# Altium footprint library con-samtec.PCBLIB: 805 footprints (part 37 of 55)
Each footprint in its own frame and in the unit in brackets; x right, y up, seen from the top. Pads: shape width x height; smd on the part's side, far side on the other; paste and mask are expansions set on the pad; w line width, h text height; cw(c..) or ccw(c..) is an arc to the next point about the centre after c.
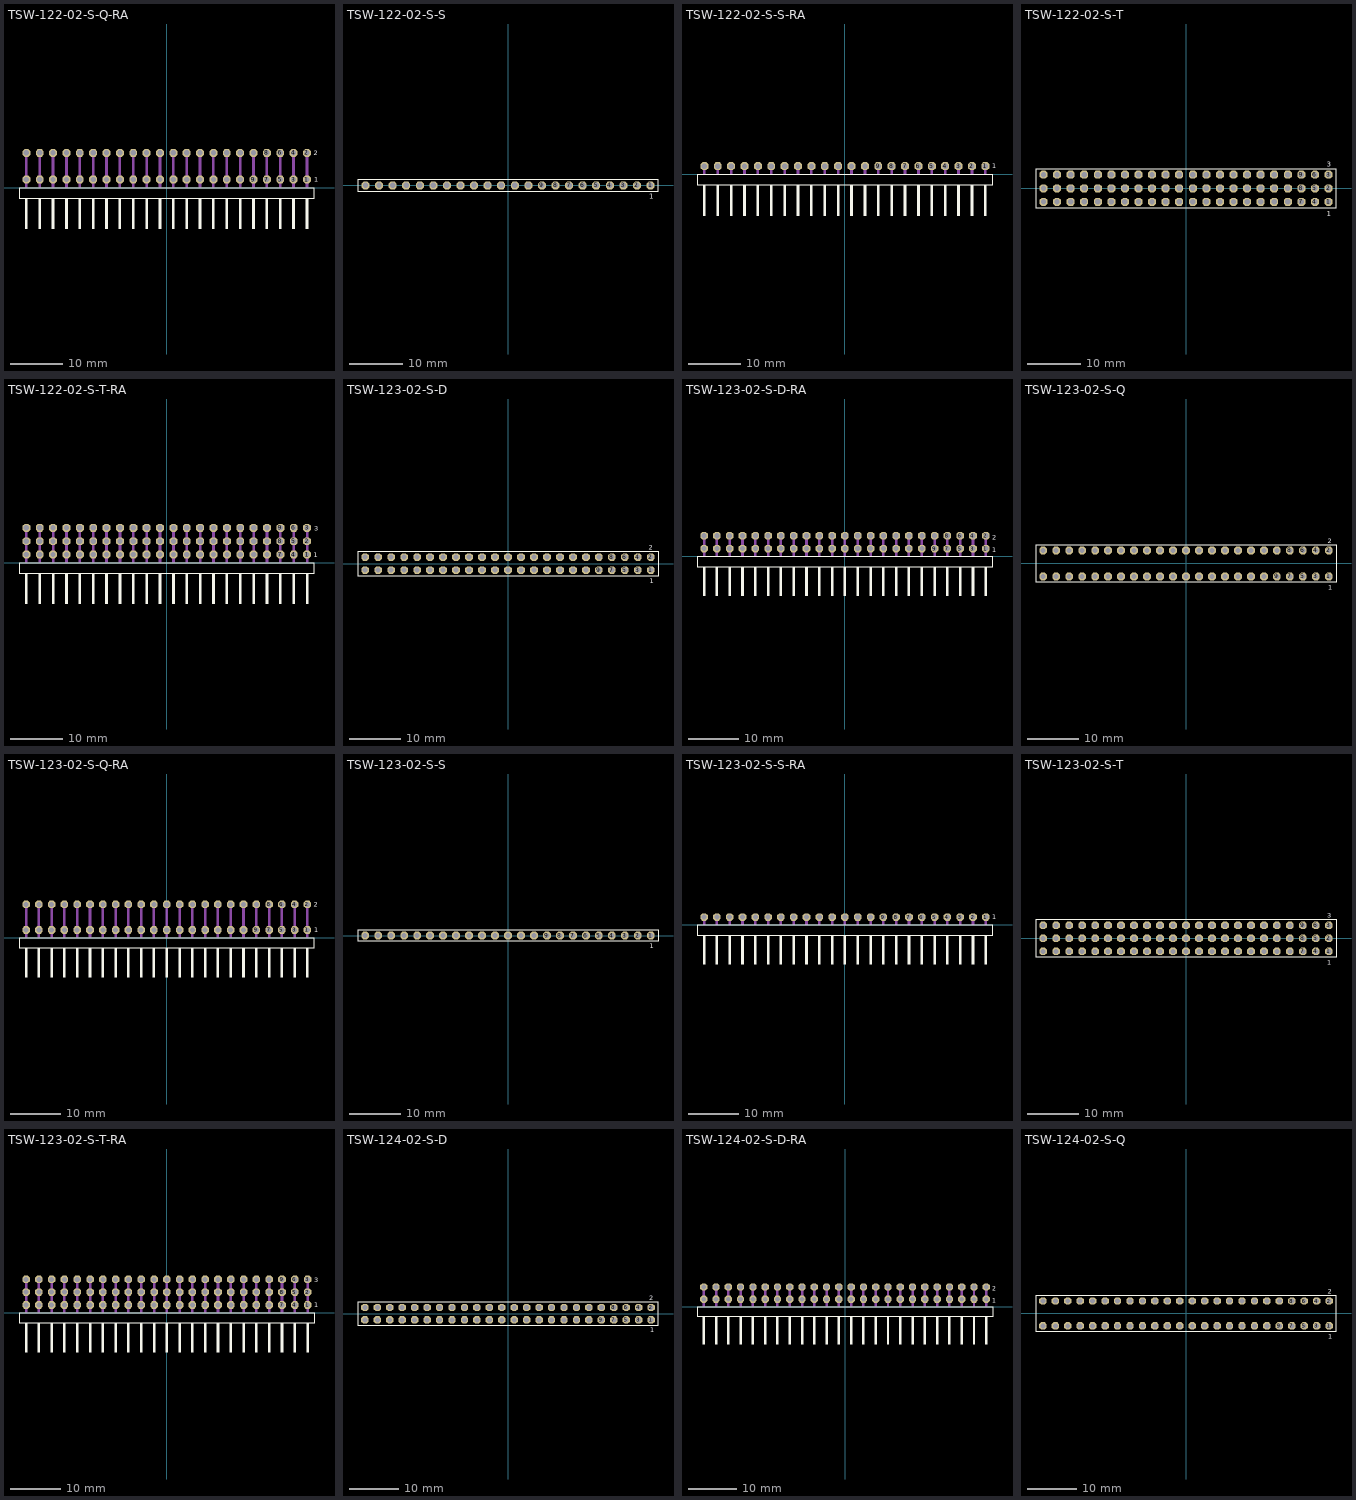
[diagram p36: the footprints below, top view; thin cyan lines are the x and y axes]

## TSW-122-02-S-Q-RA [mil]
pads (44):
  oct 59.06x59.06 hole 39.37: 1(1050,60) 2(1050,260) 3(950,60) 4(950,260) 5(850,60) 6(850,260) 7(750,60) 8(750,260) 9(650,60) 10(650,260) 11(550,60) 12(550,260) 13(450,60) 14(450,260) 15(350,60) 16(350,260) 17(250,60) 18(250,260) 19(150,60) 20(150,260) 21(50,60) 22(50,260) 23(-50,60) 24(-50,260) 25(-150,60) 26(-150,260) 27(-250,60) 28(-250,260) 29(-350,60) 30(-350,260) 31(-450,60) 32(-450,260) 33(-550,60) 34(-550,260) 35(-650,60) 36(-650,260) 37(-750,60) 38(-750,260) 39(-850,60) 40(-850,260) 41(-950,60) 42(-950,260) 43(-1050,60) 44(-1050,260)
Top Overlay:
  rectangle: -1060,-310.63 -1040,-80.32
  rectangle: -960,-310.63 -940,-80.32
  rectangle: -860,-310.63 -840,-80.32
  rectangle: -760,-310.63 -740,-80.32
  rectangle: -660,-310.63 -640,-80.32
  rectangle: -560,-310.63 -540,-80.32
  rectangle: -460,-310.63 -440,-80.32
  rectangle: -360,-310.63 -340,-80.32
  rectangle: -260,-310.63 -240,-80.32
  rectangle: -160,-310.63 -140,-80.32
  rectangle: -60,-310.63 -40,-80.32
  rectangle: 40,-310.63 60,-80.32
  rectangle: 140,-310.63 160,-80.32
  rectangle: 240,-310.63 260,-80.32
  rectangle: 340,-310.63 360,-80.32
  rectangle: 440,-310.63 460,-80.32
  rectangle: 540,-310.63 560,-80.32
  rectangle: 640,-310.63 660,-80.32
  rectangle: 740,-310.63 760,-80.32
  rectangle: 840,-310.63 860,-80.32
  rectangle: 940,-310.63 960,-80.32
  rectangle: 1040,-310.63 1060,-80.32
  lines w8: -1105.08,-80.55 1105.08,-80.55 1105.08,-4.17 -1105.08,-4.17 -1105.08,-80.55
  text "1" at 1103.54,43.31 h36.81
  text "2" at 1101.18,242.72 h36.81
Mechanical 16:
  rectangle: -1060,0 -1040,270
  rectangle: -960,0 -940,270
  rectangle: -860,0 -840,270
  rectangle: -760,0 -740,270
  rectangle: -660,0 -640,270
  rectangle: -560,0 -540,270
  rectangle: -460,0 -440,270
  rectangle: -360,0 -340,270
  rectangle: -260,0 -240,270
  rectangle: -160,0 -140,270
  rectangle: -60,0 -40,270
  rectangle: 40,0 60,270
  rectangle: 140,0 160,270
  rectangle: 240,0 260,270
  rectangle: 340,0 360,270
  rectangle: 440,0 460,270
  rectangle: 540,0 560,270
  rectangle: 640,0 660,270
  rectangle: 740,0 760,270
  rectangle: 840,0 860,270
  rectangle: 940,0 960,270
  rectangle: 1040,0 1060,270

## TSW-122-02-S-S [mm]
pads (22):
  oct 1.5x1.5 hole 1: 1(26.67,0) 2(24.13,0) 3(21.59,0) 4(19.05,0) 5(16.51,0) 6(13.97,0) 7(11.43,0) 8(8.89,0) 9(6.35,0) 10(3.81,0) 11(1.27,0) 12(-1.27,0) 13(-3.81,0) 14(-6.35,0) 15(-8.89,0) 16(-11.43,0) 17(-13.97,0) 18(-16.51,0) 19(-19.05,0) 20(-21.59,0) 21(-24.13,0) 22(-26.67,0)
Top Overlay:
  lines w0.203: -28.069,-1.155 28.069,-1.155 28.069,1.155 -28.069,1.155 -28.069,-1.155
  text "1" at 26.412,-2.498 h0.94
Mechanical 16:
  rectangle: -27.02,-0.35 -26.32,0.35
  rectangle: -24.48,-0.35 -23.78,0.35
  rectangle: -21.94,-0.35 -21.24,0.35
  rectangle: -19.4,-0.35 -18.7,0.35
  rectangle: -16.86,-0.35 -16.16,0.35
  rectangle: -14.32,-0.35 -13.62,0.35
  rectangle: -11.78,-0.35 -11.08,0.35
  rectangle: -9.24,-0.35 -8.54,0.35
  rectangle: -6.7,-0.35 -6,0.35
  rectangle: -4.16,-0.35 -3.46,0.35
  rectangle: -1.62,-0.35 -0.92,0.35
  rectangle: 0.92,-0.35 1.62,0.35
  rectangle: 3.46,-0.35 4.16,0.35
  rectangle: 6,-0.35 6.7,0.35
  rectangle: 8.54,-0.35 9.24,0.35
  rectangle: 11.08,-0.35 11.78,0.35
  rectangle: 13.62,-0.35 14.32,0.35
  rectangle: 16.16,-0.35 16.86,0.35
  rectangle: 18.7,-0.35 19.4,0.35
  rectangle: 21.24,-0.35 21.94,0.35
  rectangle: 23.78,-0.35 24.48,0.35
  rectangle: 26.32,-0.35 27.02,0.35

## TSW-122-02-S-S-RA [mil]
pads (22):
  oct 59.06x59.06 hole 39.37: 1(1050,60) 2(950,60) 3(850,60) 4(750,60) 5(650,60) 6(550,60) 7(450,60) 8(350,60) 9(250,60) 10(150,60) 11(50,60) 12(-50,60) 13(-150,60) 14(-250,60) 15(-350,60) 16(-450,60) 17(-550,60) 18(-650,60) 19(-750,60) 20(-850,60) 21(-950,60) 22(-1050,60)
Top Overlay:
  rectangle: -1060,-310.63 -1040,-80.32
  rectangle: -960,-310.63 -940,-80.32
  rectangle: -860,-310.63 -840,-80.32
  rectangle: -760,-310.63 -740,-80.32
  rectangle: -660,-310.63 -640,-80.32
  rectangle: -560,-310.63 -540,-80.32
  rectangle: -460,-310.63 -440,-80.32
  rectangle: -360,-310.63 -340,-80.32
  rectangle: -260,-310.63 -240,-80.32
  rectangle: -160,-310.63 -140,-80.32
  rectangle: -60,-310.63 -40,-80.32
  rectangle: 40,-310.63 60,-80.32
  rectangle: 140,-310.63 160,-80.32
  rectangle: 240,-310.63 260,-80.32
  rectangle: 340,-310.63 360,-80.32
  rectangle: 440,-310.63 460,-80.32
  rectangle: 540,-310.63 560,-80.32
  rectangle: 640,-310.63 660,-80.32
  rectangle: 740,-310.63 760,-80.32
  rectangle: 840,-310.63 860,-80.32
  rectangle: 940,-310.63 960,-80.32
  rectangle: 1040,-310.63 1060,-80.32
  lines w8: -1105.08,-80.55 1105.08,-80.55 1105.08,-4.17 -1105.08,-4.17 -1105.08,-80.55
  text "1" at 1100.47,45.35 h36.81
Mechanical 16:
  rectangle: -1060,0 -1040,70
  rectangle: -960,0 -940,70
  rectangle: -860,0 -840,70
  rectangle: -760,0 -740,70
  rectangle: -660,0 -640,70
  rectangle: -560,0 -540,70
  rectangle: -460,0 -440,70
  rectangle: -360,0 -340,70
  rectangle: -260,0 -240,70
  rectangle: -160,0 -140,70
  rectangle: -60,0 -40,70
  rectangle: 40,0 60,70
  rectangle: 140,0 160,70
  rectangle: 240,0 260,70
  rectangle: 340,0 360,70
  rectangle: 440,0 460,70
  rectangle: 540,0 560,70
  rectangle: 640,0 660,70
  rectangle: 740,0 760,70
  rectangle: 840,0 860,70
  rectangle: 940,0 960,70
  rectangle: 1040,0 1060,70

## TSW-122-02-S-T [mm]
pads (66):
  oct 1.5x1.5 hole 1: 1(26.67,-2.54) 2(26.67,0) 3(26.67,2.54) 4(24.13,-2.54) 5(24.13,0) 6(24.13,2.54) 7(21.59,-2.54) 8(21.59,0) 9(21.59,2.54) 10(19.05,-2.54) 11(19.05,0) 12(19.05,2.54) 13(16.51,-2.54) 14(16.51,0) 15(16.51,2.54) 16(13.97,-2.54) 17(13.97,0) 18(13.97,2.54) 19(11.43,-2.54) 20(11.43,0) 21(11.43,2.54) 22(8.89,-2.54) 23(8.89,0) 24(8.89,2.54) 25(6.35,-2.54) 26(6.35,0) 27(6.35,2.54) 28(3.81,-2.54) 29(3.81,0) 30(3.81,2.54) 31(1.27,-2.54) 32(1.27,0) 33(1.27,2.54) 34(-1.27,-2.54) 35(-1.27,0) 36(-1.27,2.54) 37(-3.81,-2.54) 38(-3.81,0) 39(-3.81,2.54) 40(-6.35,-2.54) 41(-6.35,0) 42(-6.35,2.54) 43(-8.89,-2.54) 44(-8.89,0) 45(-8.89,2.54) 46(-11.43,-2.54) 47(-11.43,0) 48(-11.43,2.54) 49(-13.97,-2.54) 50(-13.97,0) 51(-13.97,2.54) 52(-16.51,-2.54) 53(-16.51,0) 54(-16.51,2.54) 55(-19.05,-2.54) 56(-19.05,0) 57(-19.05,2.54) 58(-21.59,-2.54) 59(-21.59,0) 60(-21.59,2.54) 61(-24.13,-2.54) 62(-24.13,0) 63(-24.13,2.54) 64(-26.67,-2.54) 65(-26.67,0) 66(-26.67,2.54)
Top Overlay:
  lines w0.203: -28.069,-3.695 28.069,-3.695 28.069,3.695 -28.069,3.695 -28.069,-3.695
  text "1" at 26.362,-5.188 h0.94
  text "3" at 26.358,3.989 h0.94
Mechanical 16:
  rectangle: -27.02,-2.89 -26.32,-2.19
  rectangle: -27.02,-0.35 -26.32,0.35
  rectangle: -27.02,2.19 -26.32,2.89
  rectangle: -24.48,-2.89 -23.78,-2.19
  rectangle: -24.48,-0.35 -23.78,0.35
  rectangle: -24.48,2.19 -23.78,2.89
  rectangle: -21.94,-2.89 -21.24,-2.19
  rectangle: -21.94,-0.35 -21.24,0.35
  rectangle: -21.94,2.19 -21.24,2.89
  rectangle: -19.4,-2.89 -18.7,-2.19
  rectangle: -19.4,-0.35 -18.7,0.35
  rectangle: -19.4,2.19 -18.7,2.89
  rectangle: -16.86,-2.89 -16.16,-2.19
  rectangle: -16.86,-0.35 -16.16,0.35
  rectangle: -16.86,2.19 -16.16,2.89
  rectangle: -14.32,-2.89 -13.62,-2.19
  rectangle: -14.32,-0.35 -13.62,0.35
  rectangle: -14.32,2.19 -13.62,2.89
  rectangle: -11.78,-2.89 -11.08,-2.19
  rectangle: -11.78,-0.35 -11.08,0.35
  rectangle: -11.78,2.19 -11.08,2.89
  rectangle: -9.24,-2.89 -8.54,-2.19
  rectangle: -9.24,-0.35 -8.54,0.35
  rectangle: -9.24,2.19 -8.54,2.89
  rectangle: -6.7,-2.89 -6,-2.19
  rectangle: -6.7,-0.35 -6,0.35
  rectangle: -6.7,2.19 -6,2.89
  rectangle: -4.16,-2.89 -3.46,-2.19
  rectangle: -4.16,-0.35 -3.46,0.35
  rectangle: -4.16,2.19 -3.46,2.89
  rectangle: -1.62,-2.89 -0.92,-2.19
  rectangle: -1.62,-0.35 -0.92,0.35
  rectangle: -1.62,2.19 -0.92,2.89
  rectangle: 0.92,-2.89 1.62,-2.19
  rectangle: 0.92,-0.35 1.62,0.35
  rectangle: 0.92,2.19 1.62,2.89
  rectangle: 3.46,-2.89 4.16,-2.19
  rectangle: 3.46,-0.35 4.16,0.35
  rectangle: 3.46,2.19 4.16,2.89
  rectangle: 6,-2.89 6.7,-2.19
  rectangle: 6,-0.35 6.7,0.35
  rectangle: 6,2.19 6.7,2.89
  rectangle: 8.54,-2.89 9.24,-2.19
  rectangle: 8.54,-0.35 9.24,0.35
  rectangle: 8.54,2.19 9.24,2.89
  rectangle: 11.08,-2.89 11.78,-2.19
  rectangle: 11.08,-0.35 11.78,0.35
  rectangle: 11.08,2.19 11.78,2.89
  rectangle: 13.62,-2.89 14.32,-2.19
  rectangle: 13.62,-0.35 14.32,0.35
  rectangle: 13.62,2.19 14.32,2.89
  rectangle: 16.16,-2.89 16.86,-2.19
  rectangle: 16.16,-0.35 16.86,0.35
  rectangle: 16.16,2.19 16.86,2.89
  rectangle: 18.7,-2.89 19.4,-2.19
  rectangle: 18.7,-0.35 19.4,0.35
  rectangle: 18.7,2.19 19.4,2.89
  rectangle: 21.24,-2.89 21.94,-2.19
  rectangle: 21.24,-0.35 21.94,0.35
  rectangle: 21.24,2.19 21.94,2.89
  rectangle: 23.78,-2.89 24.48,-2.19
  rectangle: 23.78,-0.35 24.48,0.35
  rectangle: 23.78,2.19 24.48,2.89
  rectangle: 26.32,-2.89 27.02,-2.19
  rectangle: 26.32,-0.35 27.02,0.35
  rectangle: 26.32,2.19 27.02,2.89

## TSW-122-02-S-T-RA [mil]
pads (66):
  oct 59.06x59.06 hole 39.37: 1(1050,60) 2(1050,160) 3(1050,260) 4(950,60) 5(950,160) 6(950,260) 7(850,60) 8(850,160) 9(850,260) 10(750,60) 11(750,160) 12(750,260) 13(650,60) 14(650,160) 15(650,260) 16(550,60) 17(550,160) 18(550,260) 19(450,60) 20(450,160) 21(450,260) 22(350,60) 23(350,160) 24(350,260) 25(250,60) 26(250,160) 27(250,260) 28(150,60) 29(150,160) 30(150,260) 31(50,60) 32(50,160) 33(50,260) 34(-50,60) 35(-50,160) 36(-50,260) 37(-150,60) 38(-150,160) 39(-150,260) 40(-250,60) 41(-250,160) 42(-250,260) 43(-350,60) 44(-350,160) 45(-350,260) 46(-450,60) 47(-450,160) 48(-450,260) 49(-550,60) 50(-550,160) 51(-550,260) 52(-650,60) 53(-650,160) 54(-650,260) 55(-750,60) 56(-750,160) 57(-750,260) 58(-850,60) 59(-850,160) 60(-850,260) 61(-950,60) 62(-950,160) 63(-950,260) 64(-1050,60) 65(-1050,160) 66(-1050,260)
Top Overlay:
  rectangle: -1060,-310.63 -1040,-80.32
  rectangle: -960,-310.63 -940,-80.32
  rectangle: -860,-310.63 -840,-80.32
  rectangle: -760,-310.63 -740,-80.32
  rectangle: -660,-310.63 -640,-80.32
  rectangle: -560,-310.63 -540,-80.32
  rectangle: -460,-310.63 -440,-80.32
  rectangle: -360,-310.63 -340,-80.32
  rectangle: -260,-310.63 -240,-80.32
  rectangle: -160,-310.63 -140,-80.32
  rectangle: -60,-310.63 -40,-80.32
  rectangle: 40,-310.63 60,-80.32
  rectangle: 140,-310.63 160,-80.32
  rectangle: 240,-310.63 260,-80.32
  rectangle: 340,-310.63 360,-80.32
  rectangle: 440,-310.63 460,-80.32
  rectangle: 540,-310.63 560,-80.32
  rectangle: 640,-310.63 660,-80.32
  rectangle: 740,-310.63 760,-80.32
  rectangle: 840,-310.63 860,-80.32
  rectangle: 940,-310.63 960,-80.32
  rectangle: 1040,-310.63 1060,-80.32
  lines w8: -1105.08,-80.55 1105.08,-80.55 1105.08,-4.17 -1105.08,-4.17 -1105.08,-80.55
  text "1" at 1101.57,41.34 h36.81
  text "3" at 1102.17,236.81 h36.81
Mechanical 16:
  rectangle: -1060,0 -1040,270
  rectangle: -960,0 -940,270
  rectangle: -860,0 -840,270
  rectangle: -760,0 -740,270
  rectangle: -660,0 -640,270
  rectangle: -560,0 -540,270
  rectangle: -460,0 -440,270
  rectangle: -360,0 -340,270
  rectangle: -260,0 -240,270
  rectangle: -160,0 -140,270
  rectangle: -60,0 -40,270
  rectangle: 40,0 60,270
  rectangle: 140,0 160,270
  rectangle: 240,0 260,270
  rectangle: 340,0 360,270
  rectangle: 440,0 460,270
  rectangle: 540,0 560,270
  rectangle: 640,0 660,270
  rectangle: 740,0 760,270
  rectangle: 840,0 860,270
  rectangle: 940,0 960,270
  rectangle: 1040,0 1060,270

## TSW-123-02-S-D [mm]
pads (46):
  oct 1.5x1.5 hole 1: 1(27.94,-1.27) 2(27.94,1.27) 3(25.4,-1.27) 4(25.4,1.27) 5(22.86,-1.27) 6(22.86,1.27) 7(20.32,-1.27) 8(20.32,1.27) 9(17.78,-1.27) 10(17.78,1.27) 11(15.24,-1.27) 12(15.24,1.27) 13(12.7,-1.27) 14(12.7,1.27) 15(10.16,-1.27) 16(10.16,1.27) 17(7.62,-1.27) 18(7.62,1.27) 19(5.08,-1.27) 20(5.08,1.27) 21(2.54,-1.27) 22(2.54,1.27) 23(0,-1.27) 24(0,1.27) 25(-2.54,-1.27) 26(-2.54,1.27) 27(-5.08,-1.27) 28(-5.08,1.27) 29(-7.62,-1.27) 30(-7.62,1.27) 31(-10.16,-1.27) 32(-10.16,1.27) 33(-12.7,-1.27) 34(-12.7,1.27) 35(-15.24,-1.27) 36(-15.24,1.27) 37(-17.78,-1.27) 38(-17.78,1.27) 39(-20.32,-1.27) 40(-20.32,1.27) 41(-22.86,-1.27) 42(-22.86,1.27) 43(-25.4,-1.27) 44(-25.4,1.27) 45(-27.94,-1.27) 46(-27.94,1.27)
Top Overlay:
  lines w0.203: -29.339,-2.425 29.339,-2.425 29.339,2.425 -29.339,2.425 -29.339,-2.425
  text "1" at 27.732,-3.818 h0.94
  text "2" at 27.557,2.744 h0.94
Mechanical 16:
  rectangle: -28.29,-1.62 -27.59,-0.92
  rectangle: -28.29,0.92 -27.59,1.62
  rectangle: -25.75,-1.62 -25.05,-0.92
  rectangle: -25.75,0.92 -25.05,1.62
  rectangle: -23.21,-1.62 -22.51,-0.92
  rectangle: -23.21,0.92 -22.51,1.62
  rectangle: -20.67,-1.62 -19.97,-0.92
  rectangle: -20.67,0.92 -19.97,1.62
  rectangle: -18.13,-1.62 -17.43,-0.92
  rectangle: -18.13,0.92 -17.43,1.62
  rectangle: -15.59,-1.62 -14.89,-0.92
  rectangle: -15.59,0.92 -14.89,1.62
  rectangle: -13.05,-1.62 -12.35,-0.92
  rectangle: -13.05,0.92 -12.35,1.62
  rectangle: -10.51,-1.62 -9.81,-0.92
  rectangle: -10.51,0.92 -9.81,1.62
  rectangle: -7.97,-1.62 -7.27,-0.92
  rectangle: -7.97,0.92 -7.27,1.62
  rectangle: -5.43,-1.62 -4.73,-0.92
  rectangle: -5.43,0.92 -4.73,1.62
  rectangle: -2.89,-1.62 -2.19,-0.92
  rectangle: -2.89,0.92 -2.19,1.62
  rectangle: -0.35,-1.62 0.35,-0.92
  rectangle: -0.35,0.92 0.35,1.62
  rectangle: 2.19,-1.62 2.89,-0.92
  rectangle: 2.19,0.92 2.89,1.62
  rectangle: 4.73,-1.62 5.43,-0.92
  rectangle: 4.73,0.92 5.43,1.62
  rectangle: 7.27,-1.62 7.97,-0.92
  rectangle: 7.27,0.92 7.97,1.62
  rectangle: 9.81,-1.62 10.51,-0.92
  rectangle: 9.81,0.92 10.51,1.62
  rectangle: 12.35,-1.62 13.05,-0.92
  rectangle: 12.35,0.92 13.05,1.62
  rectangle: 14.89,-1.62 15.59,-0.92
  rectangle: 14.89,0.92 15.59,1.62
  rectangle: 17.43,-1.62 18.13,-0.92
  rectangle: 17.43,0.92 18.13,1.62
  rectangle: 19.97,-1.62 20.67,-0.92
  rectangle: 19.97,0.92 20.67,1.62
  rectangle: 22.51,-1.62 23.21,-0.92
  rectangle: 22.51,0.92 23.21,1.62
  rectangle: 25.05,-1.62 25.75,-0.92
  rectangle: 25.05,0.92 25.75,1.62
  rectangle: 27.59,-1.62 28.29,-0.92
  rectangle: 27.59,0.92 28.29,1.62

## TSW-123-02-S-D-RA [mil]
pads (46):
  oct 59.06x59.06 hole 39.37: 1(1100,60) 2(1100,160) 3(1000,60) 4(1000,160) 5(900,60) 6(900,160) 7(800,60) 8(800,160) 9(700,60) 10(700,160) 11(600,60) 12(600,160) 13(500,60) 14(500,160) 15(400,60) 16(400,160) 17(300,60) 18(300,160) 19(200,60) 20(200,160) 21(100,60) 22(100,160) 23(0,60) 24(0,160) 25(-100,60) 26(-100,160) 27(-200,60) 28(-200,160) 29(-300,60) 30(-300,160) 31(-400,60) 32(-400,160) 33(-500,60) 34(-500,160) 35(-600,60) 36(-600,160) 37(-700,60) 38(-700,160) 39(-800,60) 40(-800,160) 41(-900,60) 42(-900,160) 43(-1000,60) 44(-1000,160) 45(-1100,60) 46(-1100,160)
Top Overlay:
  rectangle: -1110,-310.63 -1090,-80.32
  rectangle: -1010,-310.63 -990,-80.32
  rectangle: -910,-310.63 -890,-80.32
  rectangle: -810,-310.63 -790,-80.32
  rectangle: -710,-310.63 -690,-80.32
  rectangle: -610,-310.63 -590,-80.32
  rectangle: -510,-310.63 -490,-80.32
  rectangle: -410,-310.63 -390,-80.32
  rectangle: -310,-310.63 -290,-80.32
  rectangle: -210,-310.63 -190,-80.32
  rectangle: -110,-310.63 -90,-80.32
  rectangle: -10,-310.63 10,-80.32
  rectangle: 90,-310.63 110,-80.32
  rectangle: 190,-310.63 210,-80.32
  rectangle: 290,-310.63 310,-80.32
  rectangle: 390,-310.63 410,-80.32
  rectangle: 490,-310.63 510,-80.32
  rectangle: 590,-310.63 610,-80.32
  rectangle: 690,-310.63 710,-80.32
  rectangle: 790,-310.63 810,-80.32
  rectangle: 890,-310.63 910,-80.32
  rectangle: 990,-310.63 1010,-80.32
  rectangle: 1090,-310.63 1110,-80.32
  lines w8: -1155.08,-80.55 1155.08,-80.55 1155.08,-4.17 -1155.08,-4.17 -1155.08,-80.55
  text "1" at 1150.59,30.51 h36.81
  text "2" at 1149.21,129.53 h36.81
Mechanical 16:
  rectangle: -1110,0 -1090,170
  rectangle: -1010,0 -990,170
  rectangle: -910,0 -890,170
  rectangle: -810,0 -790,170
  rectangle: -710,0 -690,170
  rectangle: -610,0 -590,170
  rectangle: -510,0 -490,170
  rectangle: -410,0 -390,170
  rectangle: -310,0 -290,170
  rectangle: -210,0 -190,170
  rectangle: -110,0 -90,170
  rectangle: -10,0 10,170
  rectangle: 90,0 110,170
  rectangle: 190,0 210,170
  rectangle: 290,0 310,170
  rectangle: 390,0 410,170
  rectangle: 490,0 510,170
  rectangle: 590,0 610,170
  rectangle: 690,0 710,170
  rectangle: 790,0 810,170
  rectangle: 890,0 910,170
  rectangle: 990,0 1010,170
  rectangle: 1090,0 1110,170

## TSW-123-02-S-Q [mm]
pads (46):
  oct 1.5x1.5 hole 1: 1(27.94,-2.54) 2(27.94,2.54) 3(25.4,-2.54) 4(25.4,2.54) 5(22.86,-2.54) 6(22.86,2.54) 7(20.32,-2.54) 8(20.32,2.54) 9(17.78,-2.54) 10(17.78,2.54) 11(15.24,-2.54) 12(15.24,2.54) 13(12.7,-2.54) 14(12.7,2.54) 15(10.16,-2.54) 16(10.16,2.54) 17(7.62,-2.54) 18(7.62,2.54) 19(5.08,-2.54) 20(5.08,2.54) 21(2.54,-2.54) 22(2.54,2.54) 23(0,-2.54) 24(0,2.54) 25(-2.54,-2.54) 26(-2.54,2.54) 27(-5.08,-2.54) 28(-5.08,2.54) 29(-7.62,-2.54) 30(-7.62,2.54) 31(-10.16,-2.54) 32(-10.16,2.54) 33(-12.7,-2.54) 34(-12.7,2.54) 35(-15.24,-2.54) 36(-15.24,2.54) 37(-17.78,-2.54) 38(-17.78,2.54) 39(-20.32,-2.54) 40(-20.32,2.54) 41(-22.86,-2.54) 42(-22.86,2.54) 43(-25.4,-2.54) 44(-25.4,2.54) 45(-27.94,-2.54) 46(-27.94,2.54)
Top Overlay:
  lines w0.203: -29.339,-3.695 29.339,-3.695 29.339,3.695 -29.339,3.695 -29.339,-3.695
  text "1" at 27.782,-5.138 h0.94
  text "2" at 27.682,3.989 h0.94
Mechanical 16:
  rectangle: -28.29,-2.89 -27.59,-2.19
  rectangle: -28.29,2.19 -27.59,2.89
  rectangle: -25.75,-2.89 -25.05,-2.19
  rectangle: -25.75,2.19 -25.05,2.89
  rectangle: -23.21,-2.89 -22.51,-2.19
  rectangle: -23.21,2.19 -22.51,2.89
  rectangle: -20.67,-2.89 -19.97,-2.19
  rectangle: -20.67,2.19 -19.97,2.89
  rectangle: -18.13,-2.89 -17.43,-2.19
  rectangle: -18.13,2.19 -17.43,2.89
  rectangle: -15.59,-2.89 -14.89,-2.19
  rectangle: -15.59,2.19 -14.89,2.89
  rectangle: -13.05,-2.89 -12.35,-2.19
  rectangle: -13.05,2.19 -12.35,2.89
  rectangle: -10.51,-2.89 -9.81,-2.19
  rectangle: -10.51,2.19 -9.81,2.89
  rectangle: -7.97,-2.89 -7.27,-2.19
  rectangle: -7.97,2.19 -7.27,2.89
  rectangle: -5.43,-2.89 -4.73,-2.19
  rectangle: -5.43,2.19 -4.73,2.89
  rectangle: -2.89,-2.89 -2.19,-2.19
  rectangle: -2.89,2.19 -2.19,2.89
  rectangle: -0.35,-2.89 0.35,-2.19
  rectangle: -0.35,2.19 0.35,2.89
  rectangle: 2.19,-2.89 2.89,-2.19
  rectangle: 2.19,2.19 2.89,2.89
  rectangle: 4.73,-2.89 5.43,-2.19
  rectangle: 4.73,2.19 5.43,2.89
  rectangle: 7.27,-2.89 7.97,-2.19
  rectangle: 7.27,2.19 7.97,2.89
  rectangle: 9.81,-2.89 10.51,-2.19
  rectangle: 9.81,2.19 10.51,2.89
  rectangle: 12.35,-2.89 13.05,-2.19
  rectangle: 12.35,2.19 13.05,2.89
  rectangle: 14.89,-2.89 15.59,-2.19
  rectangle: 14.89,2.19 15.59,2.89
  rectangle: 17.43,-2.89 18.13,-2.19
  rectangle: 17.43,2.19 18.13,2.89
  rectangle: 19.97,-2.89 20.67,-2.19
  rectangle: 19.97,2.19 20.67,2.89
  rectangle: 22.51,-2.89 23.21,-2.19
  rectangle: 22.51,2.19 23.21,2.89
  rectangle: 25.05,-2.89 25.75,-2.19
  rectangle: 25.05,2.19 25.75,2.89
  rectangle: 27.59,-2.89 28.29,-2.19
  rectangle: 27.59,2.19 28.29,2.89

## TSW-123-02-S-Q-RA [mil]
pads (46):
  oct 59.06x59.06 hole 39.37: 1(1100,60) 2(1100,260) 3(1000,60) 4(1000,260) 5(900,60) 6(900,260) 7(800,60) 8(800,260) 9(700,60) 10(700,260) 11(600,60) 12(600,260) 13(500,60) 14(500,260) 15(400,60) 16(400,260) 17(300,60) 18(300,260) 19(200,60) 20(200,260) 21(100,60) 22(100,260) 23(0,60) 24(0,260) 25(-100,60) 26(-100,260) 27(-200,60) 28(-200,260) 29(-300,60) 30(-300,260) 31(-400,60) 32(-400,260) 33(-500,60) 34(-500,260) 35(-600,60) 36(-600,260) 37(-700,60) 38(-700,260) 39(-800,60) 40(-800,260) 41(-900,60) 42(-900,260) 43(-1000,60) 44(-1000,260) 45(-1100,60) 46(-1100,260)
Top Overlay:
  rectangle: -1110,-310.63 -1090,-80.32
  rectangle: -1010,-310.63 -990,-80.32
  rectangle: -910,-310.63 -890,-80.32
  rectangle: -810,-310.63 -790,-80.32
  rectangle: -710,-310.63 -690,-80.32
  rectangle: -610,-310.63 -590,-80.32
  rectangle: -510,-310.63 -490,-80.32
  rectangle: -410,-310.63 -390,-80.32
  rectangle: -310,-310.63 -290,-80.32
  rectangle: -210,-310.63 -190,-80.32
  rectangle: -110,-310.63 -90,-80.32
  rectangle: -10,-310.63 10,-80.32
  rectangle: 90,-310.63 110,-80.32
  rectangle: 190,-310.63 210,-80.32
  rectangle: 290,-310.63 310,-80.32
  rectangle: 390,-310.63 410,-80.32
  rectangle: 490,-310.63 510,-80.32
  rectangle: 590,-310.63 610,-80.32
  rectangle: 690,-310.63 710,-80.32
  rectangle: 790,-310.63 810,-80.32
  rectangle: 890,-310.63 910,-80.32
  rectangle: 990,-310.63 1010,-80.32
  rectangle: 1090,-310.63 1110,-80.32
  lines w8: -1155.08,-80.55 1155.08,-80.55 1155.08,-4.17 -1155.08,-4.17 -1155.08,-80.55
  text "1" at 1153.54,43.31 h36.81
  text "2" at 1151.18,242.72 h36.81
Mechanical 16:
  rectangle: -1110,0 -1090,270
  rectangle: -1010,0 -990,270
  rectangle: -910,0 -890,270
  rectangle: -810,0 -790,270
  rectangle: -710,0 -690,270
  rectangle: -610,0 -590,270
  rectangle: -510,0 -490,270
  rectangle: -410,0 -390,270
  rectangle: -310,0 -290,270
  rectangle: -210,0 -190,270
  rectangle: -110,0 -90,270
  rectangle: -10,0 10,270
  rectangle: 90,0 110,270
  rectangle: 190,0 210,270
  rectangle: 290,0 310,270
  rectangle: 390,0 410,270
  rectangle: 490,0 510,270
  rectangle: 590,0 610,270
  rectangle: 690,0 710,270
  rectangle: 790,0 810,270
  rectangle: 890,0 910,270
  rectangle: 990,0 1010,270
  rectangle: 1090,0 1110,270

## TSW-123-02-S-S [mm]
pads (23):
  oct 1.5x1.5 hole 1: 1(27.94,0) 2(25.4,0) 3(22.86,0) 4(20.32,0) 5(17.78,0) 6(15.24,0) 7(12.7,0) 8(10.16,0) 9(7.62,0) 10(5.08,0) 11(2.54,0) 12(0,0) 13(-2.54,0) 14(-5.08,0) 15(-7.62,0) 16(-10.16,0) 17(-12.7,0) 18(-15.24,0) 19(-17.78,0) 20(-20.32,0) 21(-22.86,0) 22(-25.4,0) 23(-27.94,0)
Top Overlay:
  lines w0.203: -29.339,-1.155 29.339,-1.155 29.339,1.155 -29.339,1.155 -29.339,-1.155
  text "1" at 27.682,-2.498 h0.94
Mechanical 16:
  rectangle: -28.29,-0.35 -27.59,0.35
  rectangle: -25.75,-0.35 -25.05,0.35
  rectangle: -23.21,-0.35 -22.51,0.35
  rectangle: -20.67,-0.35 -19.97,0.35
  rectangle: -18.13,-0.35 -17.43,0.35
  rectangle: -15.59,-0.35 -14.89,0.35
  rectangle: -13.05,-0.35 -12.35,0.35
  rectangle: -10.51,-0.35 -9.81,0.35
  rectangle: -7.97,-0.35 -7.27,0.35
  rectangle: -5.43,-0.35 -4.73,0.35
  rectangle: -2.89,-0.35 -2.19,0.35
  rectangle: -0.35,-0.35 0.35,0.35
  rectangle: 2.19,-0.35 2.89,0.35
  rectangle: 4.73,-0.35 5.43,0.35
  rectangle: 7.27,-0.35 7.97,0.35
  rectangle: 9.81,-0.35 10.51,0.35
  rectangle: 12.35,-0.35 13.05,0.35
  rectangle: 14.89,-0.35 15.59,0.35
  rectangle: 17.43,-0.35 18.13,0.35
  rectangle: 19.97,-0.35 20.67,0.35
  rectangle: 22.51,-0.35 23.21,0.35
  rectangle: 25.05,-0.35 25.75,0.35
  rectangle: 27.59,-0.35 28.29,0.35

## TSW-123-02-S-S-RA [mil]
pads (23):
  oct 59.06x59.06 hole 39.37: 1(1100,60) 2(1000,60) 3(900,60) 4(800,60) 5(700,60) 6(600,60) 7(500,60) 8(400,60) 9(300,60) 10(200,60) 11(100,60) 12(0,60) 13(-100,60) 14(-200,60) 15(-300,60) 16(-400,60) 17(-500,60) 18(-600,60) 19(-700,60) 20(-800,60) 21(-900,60) 22(-1000,60) 23(-1100,60)
Top Overlay:
  rectangle: -1110,-310.63 -1090,-80.32
  rectangle: -1010,-310.63 -990,-80.32
  rectangle: -910,-310.63 -890,-80.32
  rectangle: -810,-310.63 -790,-80.32
  rectangle: -710,-310.63 -690,-80.32
  rectangle: -610,-310.63 -590,-80.32
  rectangle: -510,-310.63 -490,-80.32
  rectangle: -410,-310.63 -390,-80.32
  rectangle: -310,-310.63 -290,-80.32
  rectangle: -210,-310.63 -190,-80.32
  rectangle: -110,-310.63 -90,-80.32
  rectangle: -10,-310.63 10,-80.32
  rectangle: 90,-310.63 110,-80.32
  rectangle: 190,-310.63 210,-80.32
  rectangle: 290,-310.63 310,-80.32
  rectangle: 390,-310.63 410,-80.32
  rectangle: 490,-310.63 510,-80.32
  rectangle: 590,-310.63 610,-80.32
  rectangle: 690,-310.63 710,-80.32
  rectangle: 790,-310.63 810,-80.32
  rectangle: 890,-310.63 910,-80.32
  rectangle: 990,-310.63 1010,-80.32
  rectangle: 1090,-310.63 1110,-80.32
  lines w8: -1155.08,-80.55 1155.08,-80.55 1155.08,-4.17 -1155.08,-4.17 -1155.08,-80.55
  text "1" at 1150.47,45.35 h36.81
Mechanical 16:
  rectangle: -1110,0 -1090,70
  rectangle: -1010,0 -990,70
  rectangle: -910,0 -890,70
  rectangle: -810,0 -790,70
  rectangle: -710,0 -690,70
  rectangle: -610,0 -590,70
  rectangle: -510,0 -490,70
  rectangle: -410,0 -390,70
  rectangle: -310,0 -290,70
  rectangle: -210,0 -190,70
  rectangle: -110,0 -90,70
  rectangle: -10,0 10,70
  rectangle: 90,0 110,70
  rectangle: 190,0 210,70
  rectangle: 290,0 310,70
  rectangle: 390,0 410,70
  rectangle: 490,0 510,70
  rectangle: 590,0 610,70
  rectangle: 690,0 710,70
  rectangle: 790,0 810,70
  rectangle: 890,0 910,70
  rectangle: 990,0 1010,70
  rectangle: 1090,0 1110,70

## TSW-123-02-S-T [mm]
pads (69):
  oct 1.5x1.5 hole 1: 1(27.94,-2.54) 2(27.94,0) 3(27.94,2.54) 4(25.4,-2.54) 5(25.4,0) 6(25.4,2.54) 7(22.86,-2.54) 8(22.86,0) 9(22.86,2.54) 10(20.32,-2.54) 11(20.32,0) 12(20.32,2.54) 13(17.78,-2.54) 14(17.78,0) 15(17.78,2.54) 16(15.24,-2.54) 17(15.24,0) 18(15.24,2.54) 19(12.7,-2.54) 20(12.7,0) 21(12.7,2.54) 22(10.16,-2.54) 23(10.16,0) 24(10.16,2.54) 25(7.62,-2.54) 26(7.62,0) 27(7.62,2.54) 28(5.08,-2.54) 29(5.08,0) 30(5.08,2.54) 31(2.54,-2.54) 32(2.54,0) 33(2.54,2.54) 34(0,-2.54) 35(0,0) 36(0,2.54) 37(-2.54,-2.54) 38(-2.54,0) 39(-2.54,2.54) 40(-5.08,-2.54) 41(-5.08,0) 42(-5.08,2.54) 43(-7.62,-2.54) 44(-7.62,0) 45(-7.62,2.54) 46(-10.16,-2.54) 47(-10.16,0) 48(-10.16,2.54) 49(-12.7,-2.54) 50(-12.7,0) 51(-12.7,2.54) 52(-15.24,-2.54) 53(-15.24,0) 54(-15.24,2.54) 55(-17.78,-2.54) 56(-17.78,0) 57(-17.78,2.54) 58(-20.32,-2.54) 59(-20.32,0) 60(-20.32,2.54) 61(-22.86,-2.54) 62(-22.86,0) 63(-22.86,2.54) 64(-25.4,-2.54) 65(-25.4,0) 66(-25.4,2.54) 67(-27.94,-2.54) 68(-27.94,0) 69(-27.94,2.54)
Top Overlay:
  lines w0.203: -29.339,-3.695 29.339,-3.695 29.339,3.695 -29.339,3.695 -29.339,-3.695
  text "1" at 27.632,-5.188 h0.94
  text "3" at 27.628,3.989 h0.94
Mechanical 16:
  rectangle: -28.29,-2.89 -27.59,-2.19
  rectangle: -28.29,-0.35 -27.59,0.35
  rectangle: -28.29,2.19 -27.59,2.89
  rectangle: -25.75,-2.89 -25.05,-2.19
  rectangle: -25.75,-0.35 -25.05,0.35
  rectangle: -25.75,2.19 -25.05,2.89
  rectangle: -23.21,-2.89 -22.51,-2.19
  rectangle: -23.21,-0.35 -22.51,0.35
  rectangle: -23.21,2.19 -22.51,2.89
  rectangle: -20.67,-2.89 -19.97,-2.19
  rectangle: -20.67,-0.35 -19.97,0.35
  rectangle: -20.67,2.19 -19.97,2.89
  rectangle: -18.13,-2.89 -17.43,-2.19
  rectangle: -18.13,-0.35 -17.43,0.35
  rectangle: -18.13,2.19 -17.43,2.89
  rectangle: -15.59,-2.89 -14.89,-2.19
  rectangle: -15.59,-0.35 -14.89,0.35
  rectangle: -15.59,2.19 -14.89,2.89
  rectangle: -13.05,-2.89 -12.35,-2.19
  rectangle: -13.05,-0.35 -12.35,0.35
  rectangle: -13.05,2.19 -12.35,2.89
  rectangle: -10.51,-2.89 -9.81,-2.19
  rectangle: -10.51,-0.35 -9.81,0.35
  rectangle: -10.51,2.19 -9.81,2.89
  rectangle: -7.97,-2.89 -7.27,-2.19
  rectangle: -7.97,-0.35 -7.27,0.35
  rectangle: -7.97,2.19 -7.27,2.89
  rectangle: -5.43,-2.89 -4.73,-2.19
  rectangle: -5.43,-0.35 -4.73,0.35
  rectangle: -5.43,2.19 -4.73,2.89
  rectangle: -2.89,-2.89 -2.19,-2.19
  rectangle: -2.89,-0.35 -2.19,0.35
  rectangle: -2.89,2.19 -2.19,2.89
  rectangle: -0.35,-2.89 0.35,-2.19
  rectangle: -0.35,-0.35 0.35,0.35
  rectangle: -0.35,2.19 0.35,2.89
  rectangle: 2.19,-2.89 2.89,-2.19
  rectangle: 2.19,-0.35 2.89,0.35
  rectangle: 2.19,2.19 2.89,2.89
  rectangle: 4.73,-2.89 5.43,-2.19
  rectangle: 4.73,-0.35 5.43,0.35
  rectangle: 4.73,2.19 5.43,2.89
  rectangle: 7.27,-2.89 7.97,-2.19
  rectangle: 7.27,-0.35 7.97,0.35
  rectangle: 7.27,2.19 7.97,2.89
  rectangle: 9.81,-2.89 10.51,-2.19
  rectangle: 9.81,-0.35 10.51,0.35
  rectangle: 9.81,2.19 10.51,2.89
  rectangle: 12.35,-2.89 13.05,-2.19
  rectangle: 12.35,-0.35 13.05,0.35
  rectangle: 12.35,2.19 13.05,2.89
  rectangle: 14.89,-2.89 15.59,-2.19
  rectangle: 14.89,-0.35 15.59,0.35
  rectangle: 14.89,2.19 15.59,2.89
  rectangle: 17.43,-2.89 18.13,-2.19
  rectangle: 17.43,-0.35 18.13,0.35
  rectangle: 17.43,2.19 18.13,2.89
  rectangle: 19.97,-2.89 20.67,-2.19
  rectangle: 19.97,-0.35 20.67,0.35
  rectangle: 19.97,2.19 20.67,2.89
  rectangle: 22.51,-2.89 23.21,-2.19
  rectangle: 22.51,-0.35 23.21,0.35
  rectangle: 22.51,2.19 23.21,2.89
  rectangle: 25.05,-2.89 25.75,-2.19
  rectangle: 25.05,-0.35 25.75,0.35
  rectangle: 25.05,2.19 25.75,2.89
  rectangle: 27.59,-2.89 28.29,-2.19
  rectangle: 27.59,-0.35 28.29,0.35
  rectangle: 27.59,2.19 28.29,2.89

## TSW-123-02-S-T-RA [mil]
pads (69):
  oct 59.06x59.06 hole 39.37: 1(1100,60) 2(1100,160) 3(1100,260) 4(1000,60) 5(1000,160) 6(1000,260) 7(900,60) 8(900,160) 9(900,260) 10(800,60) 11(800,160) 12(800,260) 13(700,60) 14(700,160) 15(700,260) 16(600,60) 17(600,160) 18(600,260) 19(500,60) 20(500,160) 21(500,260) 22(400,60) 23(400,160) 24(400,260) 25(300,60) 26(300,160) 27(300,260) 28(200,60) 29(200,160) 30(200,260) 31(100,60) 32(100,160) 33(100,260) 34(0,60) 35(0,160) 36(0,260) 37(-100,60) 38(-100,160) 39(-100,260) 40(-200,60) 41(-200,160) 42(-200,260) 43(-300,60) 44(-300,160) 45(-300,260) 46(-400,60) 47(-400,160) 48(-400,260) 49(-500,60) 50(-500,160) 51(-500,260) 52(-600,60) 53(-600,160) 54(-600,260) 55(-700,60) 56(-700,160) 57(-700,260) 58(-800,60) 59(-800,160) 60(-800,260) 61(-900,60) 62(-900,160) 63(-900,260) 64(-1000,60) 65(-1000,160) 66(-1000,260) 67(-1100,60) 68(-1100,160) 69(-1100,260)
Top Overlay:
  rectangle: -1110,-310.63 -1090,-80.32
  rectangle: -1010,-310.63 -990,-80.32
  rectangle: -910,-310.63 -890,-80.32
  rectangle: -810,-310.63 -790,-80.32
  rectangle: -710,-310.63 -690,-80.32
  rectangle: -610,-310.63 -590,-80.32
  rectangle: -510,-310.63 -490,-80.32
  rectangle: -410,-310.63 -390,-80.32
  rectangle: -310,-310.63 -290,-80.32
  rectangle: -210,-310.63 -190,-80.32
  rectangle: -110,-310.63 -90,-80.32
  rectangle: -10,-310.63 10,-80.32
  rectangle: 90,-310.63 110,-80.32
  rectangle: 190,-310.63 210,-80.32
  rectangle: 290,-310.63 310,-80.32
  rectangle: 390,-310.63 410,-80.32
  rectangle: 490,-310.63 510,-80.32
  rectangle: 590,-310.63 610,-80.32
  rectangle: 690,-310.63 710,-80.32
  rectangle: 790,-310.63 810,-80.32
  rectangle: 890,-310.63 910,-80.32
  rectangle: 990,-310.63 1010,-80.32
  rectangle: 1090,-310.63 1110,-80.32
  lines w8: -1155.08,-80.55 1155.08,-80.55 1155.08,-4.17 -1155.08,-4.17 -1155.08,-80.55
  text "1" at 1151.57,41.34 h36.81
  text "3" at 1152.17,236.81 h36.81
Mechanical 16:
  rectangle: -1110,0 -1090,270
  rectangle: -1010,0 -990,270
  rectangle: -910,0 -890,270
  rectangle: -810,0 -790,270
  rectangle: -710,0 -690,270
  rectangle: -610,0 -590,270
  rectangle: -510,0 -490,270
  rectangle: -410,0 -390,270
  rectangle: -310,0 -290,270
  rectangle: -210,0 -190,270
  rectangle: -110,0 -90,270
  rectangle: -10,0 10,270
  rectangle: 90,0 110,270
  rectangle: 190,0 210,270
  rectangle: 290,0 310,270
  rectangle: 390,0 410,270
  rectangle: 490,0 510,270
  rectangle: 590,0 610,270
  rectangle: 690,0 710,270
  rectangle: 790,0 810,270
  rectangle: 890,0 910,270
  rectangle: 990,0 1010,270
  rectangle: 1090,0 1110,270

## TSW-124-02-S-D [mm]
pads (48):
  oct 1.5x1.5 hole 1: 1(29.21,-1.27) 2(29.21,1.27) 3(26.67,-1.27) 4(26.67,1.27) 5(24.13,-1.27) 6(24.13,1.27) 7(21.59,-1.27) 8(21.59,1.27) 9(19.05,-1.27) 10(19.05,1.27) 11(16.51,-1.27) 12(16.51,1.27) 13(13.97,-1.27) 14(13.97,1.27) 15(11.43,-1.27) 16(11.43,1.27) 17(8.89,-1.27) 18(8.89,1.27) 19(6.35,-1.27) 20(6.35,1.27) 21(3.81,-1.27) 22(3.81,1.27) 23(1.27,-1.27) 24(1.27,1.27) 25(-1.27,-1.27) 26(-1.27,1.27) 27(-3.81,-1.27) 28(-3.81,1.27) 29(-6.35,-1.27) 30(-6.35,1.27) 31(-8.89,-1.27) 32(-8.89,1.27) 33(-11.43,-1.27) 34(-11.43,1.27) 35(-13.97,-1.27) 36(-13.97,1.27) 37(-16.51,-1.27) 38(-16.51,1.27) 39(-19.05,-1.27) 40(-19.05,1.27) 41(-21.59,-1.27) 42(-21.59,1.27) 43(-24.13,-1.27) 44(-24.13,1.27) 45(-26.67,-1.27) 46(-26.67,1.27) 47(-29.21,-1.27) 48(-29.21,1.27)
Top Overlay:
  lines w0.203: -30.609,-2.425 30.609,-2.425 30.609,2.425 -30.609,2.425 -30.609,-2.425
  text "1" at 29.002,-3.818 h0.94
  text "2" at 28.827,2.744 h0.94
Mechanical 16:
  rectangle: -29.56,-1.62 -28.86,-0.92
  rectangle: -29.56,0.92 -28.86,1.62
  rectangle: -27.02,-1.62 -26.32,-0.92
  rectangle: -27.02,0.92 -26.32,1.62
  rectangle: -24.48,-1.62 -23.78,-0.92
  rectangle: -24.48,0.92 -23.78,1.62
  rectangle: -21.94,-1.62 -21.24,-0.92
  rectangle: -21.94,0.92 -21.24,1.62
  rectangle: -19.4,-1.62 -18.7,-0.92
  rectangle: -19.4,0.92 -18.7,1.62
  rectangle: -16.86,-1.62 -16.16,-0.92
  rectangle: -16.86,0.92 -16.16,1.62
  rectangle: -14.32,-1.62 -13.62,-0.92
  rectangle: -14.32,0.92 -13.62,1.62
  rectangle: -11.78,-1.62 -11.08,-0.92
  rectangle: -11.78,0.92 -11.08,1.62
  rectangle: -9.24,-1.62 -8.54,-0.92
  rectangle: -9.24,0.92 -8.54,1.62
  rectangle: -6.7,-1.62 -6,-0.92
  rectangle: -6.7,0.92 -6,1.62
  rectangle: -4.16,-1.62 -3.46,-0.92
  rectangle: -4.16,0.92 -3.46,1.62
  rectangle: -1.62,-1.62 -0.92,-0.92
  rectangle: -1.62,0.92 -0.92,1.62
  rectangle: 0.92,-1.62 1.62,-0.92
  rectangle: 0.92,0.92 1.62,1.62
  rectangle: 3.46,-1.62 4.16,-0.92
  rectangle: 3.46,0.92 4.16,1.62
  rectangle: 6,-1.62 6.7,-0.92
  rectangle: 6,0.92 6.7,1.62
  rectangle: 8.54,-1.62 9.24,-0.92
  rectangle: 8.54,0.92 9.24,1.62
  rectangle: 11.08,-1.62 11.78,-0.92
  rectangle: 11.08,0.92 11.78,1.62
  rectangle: 13.62,-1.62 14.32,-0.92
  rectangle: 13.62,0.92 14.32,1.62
  rectangle: 16.16,-1.62 16.86,-0.92
  rectangle: 16.16,0.92 16.86,1.62
  rectangle: 18.7,-1.62 19.4,-0.92
  rectangle: 18.7,0.92 19.4,1.62
  rectangle: 21.24,-1.62 21.94,-0.92
  rectangle: 21.24,0.92 21.94,1.62
  rectangle: 23.78,-1.62 24.48,-0.92
  rectangle: 23.78,0.92 24.48,1.62
  rectangle: 26.32,-1.62 27.02,-0.92
  rectangle: 26.32,0.92 27.02,1.62
  rectangle: 28.86,-1.62 29.56,-0.92
  rectangle: 28.86,0.92 29.56,1.62

## TSW-124-02-S-D-RA [mil]
pads (48):
  oct 59.06x59.06 hole 39.37: 1(1150,60) 2(1150,160) 3(1050,60) 4(1050,160) 5(950,60) 6(950,160) 7(850,60) 8(850,160) 9(750,60) 10(750,160) 11(650,60) 12(650,160) 13(550,60) 14(550,160) 15(450,60) 16(450,160) 17(350,60) 18(350,160) 19(250,60) 20(250,160) 21(150,60) 22(150,160) 23(50,60) 24(50,160) 25(-50,60) 26(-50,160) 27(-150,60) 28(-150,160) 29(-250,60) 30(-250,160) 31(-350,60) 32(-350,160) 33(-450,60) 34(-450,160) 35(-550,60) 36(-550,160) 37(-650,60) 38(-650,160) 39(-750,60) 40(-750,160) 41(-850,60) 42(-850,160) 43(-950,60) 44(-950,160) 45(-1050,60) 46(-1050,160) 47(-1150,60) 48(-1150,160)
Top Overlay:
  rectangle: -1160,-310.63 -1140,-80.32
  rectangle: -1060,-310.63 -1040,-80.32
  rectangle: -960,-310.63 -940,-80.32
  rectangle: -860,-310.63 -840,-80.32
  rectangle: -760,-310.63 -740,-80.32
  rectangle: -660,-310.63 -640,-80.32
  rectangle: -560,-310.63 -540,-80.32
  rectangle: -460,-310.63 -440,-80.32
  rectangle: -360,-310.63 -340,-80.32
  rectangle: -260,-310.63 -240,-80.32
  rectangle: -160,-310.63 -140,-80.32
  rectangle: -60,-310.63 -40,-80.32
  rectangle: 40,-310.63 60,-80.32
  rectangle: 140,-310.63 160,-80.32
  rectangle: 240,-310.63 260,-80.32
  rectangle: 340,-310.63 360,-80.32
  rectangle: 440,-310.63 460,-80.32
  rectangle: 540,-310.63 560,-80.32
  rectangle: 640,-310.63 660,-80.32
  rectangle: 740,-310.63 760,-80.32
  rectangle: 840,-310.63 860,-80.32
  rectangle: 940,-310.63 960,-80.32
  rectangle: 1040,-310.63 1060,-80.32
  rectangle: 1140,-310.63 1160,-80.32
  lines w8: -1205.08,-80.55 1205.08,-80.55 1205.08,-4.17 -1205.08,-4.17 -1205.08,-80.55
  text "1" at 1200.59,30.51 h36.81
  text "2" at 1199.21,129.53 h36.81
Mechanical 16:
  rectangle: -1160,0 -1140,170
  rectangle: -1060,0 -1040,170
  rectangle: -960,0 -940,170
  rectangle: -860,0 -840,170
  rectangle: -760,0 -740,170
  rectangle: -660,0 -640,170
  rectangle: -560,0 -540,170
  rectangle: -460,0 -440,170
  rectangle: -360,0 -340,170
  rectangle: -260,0 -240,170
  rectangle: -160,0 -140,170
  rectangle: -60,0 -40,170
  rectangle: 40,0 60,170
  rectangle: 140,0 160,170
  rectangle: 240,0 260,170
  rectangle: 340,0 360,170
  rectangle: 440,0 460,170
  rectangle: 540,0 560,170
  rectangle: 640,0 660,170
  rectangle: 740,0 760,170
  rectangle: 840,0 860,170
  rectangle: 940,0 960,170
  rectangle: 1040,0 1060,170
  rectangle: 1140,0 1160,170

## TSW-124-02-S-Q [mm]
pads (48):
  oct 1.5x1.5 hole 1: 1(29.21,-2.54) 2(29.21,2.54) 3(26.67,-2.54) 4(26.67,2.54) 5(24.13,-2.54) 6(24.13,2.54) 7(21.59,-2.54) 8(21.59,2.54) 9(19.05,-2.54) 10(19.05,2.54) 11(16.51,-2.54) 12(16.51,2.54) 13(13.97,-2.54) 14(13.97,2.54) 15(11.43,-2.54) 16(11.43,2.54) 17(8.89,-2.54) 18(8.89,2.54) 19(6.35,-2.54) 20(6.35,2.54) 21(3.81,-2.54) 22(3.81,2.54) 23(1.27,-2.54) 24(1.27,2.54) 25(-1.27,-2.54) 26(-1.27,2.54) 27(-3.81,-2.54) 28(-3.81,2.54) 29(-6.35,-2.54) 30(-6.35,2.54) 31(-8.89,-2.54) 32(-8.89,2.54) 33(-11.43,-2.54) 34(-11.43,2.54) 35(-13.97,-2.54) 36(-13.97,2.54) 37(-16.51,-2.54) 38(-16.51,2.54) 39(-19.05,-2.54) 40(-19.05,2.54) 41(-21.59,-2.54) 42(-21.59,2.54) 43(-24.13,-2.54) 44(-24.13,2.54) 45(-26.67,-2.54) 46(-26.67,2.54) 47(-29.21,-2.54) 48(-29.21,2.54)
Top Overlay:
  lines w0.203: -30.609,-3.695 30.609,-3.695 30.609,3.695 -30.609,3.695 -30.609,-3.695
  text "1" at 29.052,-5.138 h0.94
  text "2" at 28.952,3.989 h0.94
Mechanical 16:
  rectangle: -29.56,-2.89 -28.86,-2.19
  rectangle: -29.56,2.19 -28.86,2.89
  rectangle: -27.02,-2.89 -26.32,-2.19
  rectangle: -27.02,2.19 -26.32,2.89
  rectangle: -24.48,-2.89 -23.78,-2.19
  rectangle: -24.48,2.19 -23.78,2.89
  rectangle: -21.94,-2.89 -21.24,-2.19
  rectangle: -21.94,2.19 -21.24,2.89
  rectangle: -19.4,-2.89 -18.7,-2.19
  rectangle: -19.4,2.19 -18.7,2.89
  rectangle: -16.86,-2.89 -16.16,-2.19
  rectangle: -16.86,2.19 -16.16,2.89
  rectangle: -14.32,-2.89 -13.62,-2.19
  rectangle: -14.32,2.19 -13.62,2.89
  rectangle: -11.78,-2.89 -11.08,-2.19
  rectangle: -11.78,2.19 -11.08,2.89
  rectangle: -9.24,-2.89 -8.54,-2.19
  rectangle: -9.24,2.19 -8.54,2.89
  rectangle: -6.7,-2.89 -6,-2.19
  rectangle: -6.7,2.19 -6,2.89
  rectangle: -4.16,-2.89 -3.46,-2.19
  rectangle: -4.16,2.19 -3.46,2.89
  rectangle: -1.62,-2.89 -0.92,-2.19
  rectangle: -1.62,2.19 -0.92,2.89
  rectangle: 0.92,-2.89 1.62,-2.19
  rectangle: 0.92,2.19 1.62,2.89
  rectangle: 3.46,-2.89 4.16,-2.19
  rectangle: 3.46,2.19 4.16,2.89
  rectangle: 6,-2.89 6.7,-2.19
  rectangle: 6,2.19 6.7,2.89
  rectangle: 8.54,-2.89 9.24,-2.19
  rectangle: 8.54,2.19 9.24,2.89
  rectangle: 11.08,-2.89 11.78,-2.19
  rectangle: 11.08,2.19 11.78,2.89
  rectangle: 13.62,-2.89 14.32,-2.19
  rectangle: 13.62,2.19 14.32,2.89
  rectangle: 16.16,-2.89 16.86,-2.19
  rectangle: 16.16,2.19 16.86,2.89
  rectangle: 18.7,-2.89 19.4,-2.19
  rectangle: 18.7,2.19 19.4,2.89
  rectangle: 21.24,-2.89 21.94,-2.19
  rectangle: 21.24,2.19 21.94,2.89
  rectangle: 23.78,-2.89 24.48,-2.19
  rectangle: 23.78,2.19 24.48,2.89
  rectangle: 26.32,-2.89 27.02,-2.19
  rectangle: 26.32,2.19 27.02,2.89
  rectangle: 28.86,-2.89 29.56,-2.19
  rectangle: 28.86,2.19 29.56,2.89